# Altium footprint library Trenz.PcbLib: 4 footprints
Each footprint in its own frame and in the unit in brackets; x right, y up, seen from the top. Pads: shape width x height; smd on the part's side, far side on the other; paste and mask are expansions set on the pad; w line width, h text height; cw(c..) or ccw(c..) is an arc to the next point about the centre after c.
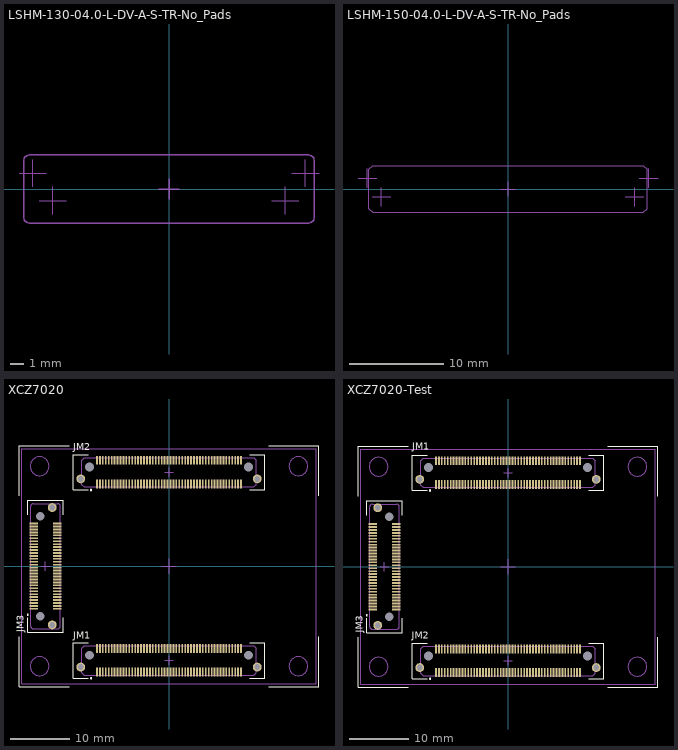
[diagram p0: the footprints below, top view; thin cyan lines are the x and y axes]

## LSHM-130-04.0-L-DV-A-S-TR-No_Pads [mm] "Hermaphroditic Terminal/Socket Strip, 2x30 Positions, Pitch 0.5mm"
Mechanical 13:
  lines w0.1: -10.625,-2.09 ccw(c-10.225,-2.09) -10.225,-2.49 10.225,-2.49 ccw(c10.225,-2.09) 10.625,-2.09 10.625,2.09 ccw(c10.225,2.09) 10.225,2.49 -10.225,2.49 ccw(c-10.225,2.09) -10.625,2.09 -10.625,-2.09
Mechanical 15:
  lines w0.05: -10.975,1.15 -8.975,1.15 ; -9.975,0.15 -9.975,2.15 ; -9.5,-0.85 -7.5,-0.85 ; -8.5,-1.85 -8.5,0.15 ; 7.5,-0.85 9.5,-0.85 ; 8.5,-1.85 8.5,0.15 ; 8.975,1.15 10.975,1.15 ; 9.975,0.15 9.975,2.15
  lines w0.1: -0.75,0 0.75,0 ; 0,-0.75 0,0.75
3D body "LSHM-130-04.0-L-DV-A-S-TR.stp": height 5.45, standoff -1.65, extent -10.399,-2.49 10.4,2.49

## LSHM-150-04.0-L-DV-A-S-TR-No_Pads [mm] "Hermaphroditic Terminal/Socket Strip, 2x50 Positions, Pitch 0.5mm"
Mechanical 13:
  lines w0.1: -14.85,-2.09 -14.45,-2.49 14.45,-2.49 14.85,-2.09 14.85,2.09 14.45,2.49 -14.45,2.49 -14.85,2.09 -14.85,-2.09
Mechanical 15:
  lines w0.05: -16,1.15 -14,1.15 ; -15,0.15 -15,2.15 ; -14.5,-0.85 -12.5,-0.85 ; -13.5,-1.85 -13.5,0.15 ; 12.5,-0.85 14.5,-0.85 ; 13.5,-1.85 13.5,0.15 ; 14,1.15 16,1.15 ; 15,0.15 15,2.15
  lines w0.1: -0.75,0 0.75,0 ; 0,-0.75 0,0.75
3D body "LSHM-150-04.0-L-DV-A-S-TR.stp": height 5.45, standoff -1.65, extent -15.399,-2.49 15.399,2.49

## XCZ7020 [mm] "SoC w/ Xilinx Zynq Module, 40x50mm"
pads (272):
  round 1.5 hole 1 mask+0.075: G1(-19.85,-9.975) G1(-15,-17.15) G1(-15,14.85) G2(-19.85,9.975) G2(15,-17.15) G2(15,14.85)
  rect 0.3x1.5 smd mask+0.05: JM1_01(-12.25,-14) JM1_02(-12.25,-18) JM1_03(-11.75,-14) JM1_04(-11.75,-18) JM1_05(-11.25,-14) JM1_06(-11.25,-18) JM1_07(-10.75,-14) JM1_08(-10.75,-18) JM1_09(-10.25,-14) JM1_10(-10.25,-18) JM1_11(-9.75,-14) JM1_12(-9.75,-18) JM1_13(-9.25,-14) JM1_14(-9.25,-18) JM1_15(-8.75,-14) JM1_16(-8.75,-18) JM1_17(-8.25,-14) JM1_18(-8.25,-18) JM1_19(-7.75,-14) JM1_20(-7.75,-18) JM1_21(-7.25,-14) JM1_22(-7.25,-18) JM1_23(-6.75,-14) JM1_24(-6.75,-18) JM1_25(-6.25,-14) JM1_26(-6.25,-18) JM1_27(-5.75,-14) JM1_28(-5.75,-18) JM1_29(-5.25,-14) JM1_30(-5.25,-18) JM1_31(-4.75,-14) JM1_32(-4.75,-18) JM1_33(-4.25,-14) JM1_34(-4.25,-18) JM1_35(-3.75,-14) JM1_36(-3.75,-18) JM1_37(-3.25,-14) JM1_38(-3.25,-18) JM1_39(-2.75,-14) JM1_40(-2.75,-18) JM1_41(-2.25,-14) JM1_42(-2.25,-18) JM1_43(-1.75,-14) JM1_44(-1.75,-18) JM1_45(-1.25,-14) JM1_46(-1.25,-18) JM1_47(-0.75,-14) JM1_48(-0.75,-18) JM1_49(-0.25,-14) JM1_50(-0.25,-18) JM1_51(0.25,-14) JM1_52(0.25,-18) JM1_53(0.75,-14) JM1_54(0.75,-18) JM1_55(1.25,-14) JM1_56(1.25,-18) JM1_57(1.75,-14) JM1_58(1.75,-18) JM1_59(2.25,-14) JM1_60(2.25,-18) JM1_61(2.75,-14) JM1_62(2.75,-18) JM1_63(3.25,-14) JM1_64(3.25,-18) JM1_65(3.75,-14) JM1_66(3.75,-18) JM1_67(4.25,-14) JM1_68(4.25,-18) JM1_69(4.75,-14) JM1_70(4.75,-18) JM1_71(5.25,-14) JM1_72(5.25,-18) JM1_73(5.75,-14) JM1_74(5.75,-18) JM1_75(6.25,-14) JM1_76(6.25,-18) JM1_77(6.75,-14) JM1_78(6.75,-18) JM1_79(7.25,-14) JM1_80(7.25,-18) JM1_81(7.75,-14) JM1_82(7.75,-18) JM1_83(8.25,-14) JM1_84(8.25,-18) JM1_85(8.75,-14) JM1_86(8.75,-18) JM1_87(9.25,-14) JM1_88(9.25,-18) JM1_89(9.75,-14) JM1_90(9.75,-18) JM1_91(10.25,-14) JM1_92(10.25,-18) JM1_93(10.75,-14) JM1_94(10.75,-18) JM1_95(11.25,-14) JM1_96(11.25,-18) JM1_97(11.75,-14) JM1_98(11.75,-18) JM1_99(12.25,-14) JM1_100(12.25,-18) JM2_01(-12.25,18) JM2_02(-12.25,14) JM2_03(-11.75,18) JM2_04(-11.75,14) JM2_05(-11.25,18) JM2_06(-11.25,14) JM2_07(-10.75,18) JM2_08(-10.75,14) JM2_09(-10.25,18) JM2_10(-10.25,14) JM2_11(-9.75,18) JM2_12(-9.75,14) JM2_13(-9.25,18) JM2_14(-9.25,14) JM2_15(-8.75,18) JM2_16(-8.75,14) JM2_17(-8.25,18) JM2_18(-8.25,14) JM2_19(-7.75,18) JM2_20(-7.75,14) JM2_21(-7.25,18) JM2_22(-7.25,14) JM2_23(-6.75,18) JM2_24(-6.75,14) JM2_25(-6.25,18) JM2_26(-6.25,14) JM2_27(-5.75,18) JM2_28(-5.75,14) JM2_29(-5.25,18) JM2_30(-5.25,14) JM2_31(-4.75,18) JM2_32(-4.75,14) JM2_33(-4.25,18) JM2_34(-4.25,14) JM2_35(-3.75,18) JM2_36(-3.75,14) JM2_37(-3.25,18) JM2_38(-3.25,14) JM2_39(-2.75,18) JM2_40(-2.75,14) JM2_41(-2.25,18) JM2_42(-2.25,14) JM2_43(-1.75,18) JM2_44(-1.75,14) JM2_45(-1.25,18) JM2_46(-1.25,14) JM2_47(-0.75,18) JM2_48(-0.75,14) JM2_49(-0.25,18) JM2_50(-0.25,14) JM2_51(0.25,18) JM2_52(0.25,14) JM2_53(0.75,18) JM2_54(0.75,14) JM2_55(1.25,18) JM2_56(1.25,14) JM2_57(1.75,18) JM2_58(1.75,14) JM2_59(2.25,18) JM2_60(2.25,14) JM2_61(2.75,18) JM2_62(2.75,14) JM2_63(3.25,18) JM2_64(3.25,14) JM2_65(3.75,18) JM2_66(3.75,14) JM2_67(4.25,18) JM2_68(4.25,14) JM2_69(4.75,18) JM2_70(4.75,14) JM2_71(5.25,18) JM2_72(5.25,14) JM2_73(5.75,18) JM2_74(5.75,14) JM2_75(6.25,18) JM2_76(6.25,14) JM2_77(6.75,18) JM2_78(6.75,14) JM2_79(7.25,18) JM2_80(7.25,14) JM2_81(7.75,18) JM2_82(7.75,14) JM2_83(8.25,18) JM2_84(8.25,14) JM2_85(8.75,18) JM2_86(8.75,14) JM2_87(9.25,18) JM2_88(9.25,14) JM2_89(9.75,18) JM2_90(9.75,14) JM2_91(10.25,18) JM2_92(10.25,14) JM2_93(10.75,18) JM2_94(10.75,14) JM2_95(11.25,18) JM2_96(11.25,14) JM2_97(11.75,18) JM2_98(11.75,14) JM2_99(12.25,18) JM2_100(12.25,14)
  rect 1.5x0.3 smd mask+0.05: JM3_01(-23,-7.25) JM3_02(-19,-7.25) JM3_03(-23,-6.75) JM3_04(-19,-6.75) JM3_05(-23,-6.25) JM3_06(-19,-6.25) JM3_07(-23,-5.75) JM3_08(-19,-5.75) JM3_09(-23,-5.25) JM3_10(-19,-5.25) JM3_11(-23,-4.75) JM3_12(-19,-4.75) JM3_13(-23,-4.25) JM3_14(-19,-4.25) JM3_15(-23,-3.75) JM3_16(-19,-3.75) JM3_17(-23,-3.25) JM3_18(-19,-3.25) JM3_19(-23,-2.75) JM3_20(-19,-2.75) JM3_21(-23,-2.25) JM3_22(-19,-2.25) JM3_23(-23,-1.75) JM3_24(-19,-1.75) JM3_25(-23,-1.25) JM3_26(-19,-1.25) JM3_27(-23,-0.75) JM3_28(-19,-0.75) JM3_29(-23,-0.25) JM3_30(-19,-0.25) JM3_31(-23,0.25) JM3_32(-19,0.25) JM3_33(-23,0.75) JM3_34(-19,0.75) JM3_35(-23,1.25) JM3_36(-19,1.25) JM3_37(-23,1.75) JM3_38(-19,1.75) JM3_39(-23,2.25) JM3_40(-19,2.25) JM3_41(-23,2.75) JM3_42(-19,2.75) JM3_43(-23,3.25) JM3_44(-19,3.25) JM3_45(-23,3.75) JM3_46(-19,3.75) JM3_47(-23,4.25) JM3_48(-19,4.25) JM3_49(-23,4.75) JM3_50(-19,4.75) JM3_51(-23,5.25) JM3_52(-19,5.25) JM3_53(-23,5.75) JM3_54(-19,5.75) JM3_55(-23,6.25) JM3_56(-19,6.25) JM3_57(-23,6.75) JM3_58(-19,6.75) JM3_59(-23,7.25) JM3_60(-19,7.25)
  round 0 hole 1.45 unplated: MH(-21.85,-8.5) MH(-21.85,8.5)
  round 0 hole 1.5 unplated: MH(-13.5,-15.15) MH(-13.5,16.85) MH(13.5,-15.15) MH(13.5,16.85)
Top Overlay:
  circle w0.2: c-24,-8.25 r0.1
  circle w0.2: c-13.25,-19.035 r0.1
  circle w0.2: c-13.25,12.965 r0.1
  lines w0.2: -25.5,-12 -25.5,-20.5 -17,-20.5 ; -25.5,12 -25.5,20.5 -17,20.5 ; -24,-8.75 -24,-11.25 -18,-11.25 -18,-8.75 ; -24,8.75 -24,11.25 -18,11.25 -18,8.75 ; -13.75,-19.035 -16.25,-19.035 -16.25,-13.035 -13.75,-13.035 ; -13.75,12.965 -16.25,12.965 -16.25,18.965 -13.75,18.965 ; 13.75,-19.035 16.25,-19.035 16.25,-13.035 13.75,-13.035 ; 13.75,12.965 16.25,12.965 16.25,18.965 13.75,18.965 ; 17,-20.5 25.5,-20.5 25.5,-12 ; 17,20.5 25.5,20.5 25.5,12
  text "JM3" at -24.25,-11.25 h2
  text "JM2" at -16.25,19.25 h2
  text "JM1" at -16.25,-12.75 h2
Top Paste:
  region: -19.85,-10.983 -19.589,-10.949 -19.346,-10.848 -19.137,-10.688 -18.977,-10.479 -18.876,-10.236 -18.841,-9.975 -18.876,-9.714 -18.977,-9.47 -19.137,-9.262 -19.346,-9.101 -19.589,-9.001 -19.85,-8.966 -20.111,-9.001 -20.354,-9.101 -20.563,-9.262 -20.724,-9.47 -20.824,-9.714 -20.859,-9.975 -20.824,-10.236 -20.724,-10.479 -20.563,-10.688 -20.354,-10.848 -20.111,-10.949
  region: -19.85,8.967 -19.589,9.001 -19.346,9.102 -19.137,9.262 -18.977,9.471 -18.876,9.714 -18.841,9.975 -18.876,10.236 -18.977,10.48 -19.137,10.688 -19.346,10.849 -19.589,10.949 -19.85,10.984 -20.111,10.949 -20.354,10.849 -20.563,10.688 -20.724,10.48 -20.824,10.236 -20.859,9.975 -20.824,9.714 -20.724,9.471 -20.563,9.262 -20.354,9.102 -20.111,9.001
Mechanical 13:
  circle w0.1: c-22,17 r1.6
  circle w0.1: c-22,-17 r1.6
  circle w0.1: c22,-17 r1.6
  circle w0.1: c22,17 r1.6
  lines w0.1: -25,-20 25,-20 25,20 -25,20 -25,-20 ; -23.49,-10.225 ccw(c-23.09,-10.225) -23.09,-10.625 -18.91,-10.625 ccw(c-18.91,-10.225) -18.51,-10.225 -18.51,10.225 ccw(c-18.91,10.225) -18.91,10.625 -23.09,10.625 ccw(c-23.09,10.225) -23.49,10.225 -23.49,-10.225 ; -14.85,-18.125 -14.85,-13.945 -14.45,-13.545 14.45,-13.545 14.85,-13.945 14.85,-18.125 14.45,-18.525 -14.45,-18.525 -14.85,-18.125 ; -14.85,13.875 -14.45,13.475 14.45,13.475 14.85,13.875 14.85,18.055 14.45,18.455 -14.45,18.455 -14.85,18.055 -14.85,13.875
Mechanical 15:
  lines w0.1: -21.75,0 -20.25,0 ; -21,-0.75 -21,0.75 ; -1.25,0 1.25,0 ; -0.75,-16 0.75,-16 ; -0.75,16 0.75,16 ; 0,-16.75 0,-15.25 ; 0,-1.25 0,1.25 ; 0,15.215 0,16.715
3D body "TE0720-03.step": height 11.15, standoff 2.31, extent -25,-20 25,20

## XCZ7020-Test [mm] "SoC w/ Xilinx Zynq Module, 40x50mm"
pads (272):
  round 1.5 hole 1 mask+0.075: G1(-22.15,-9.975) G1(-15,-17.15) G1(-15,14.85) G2(-22.15,10.025) G2(15,-17.15) G2(15,14.85)
  rect 0.3x1.5 smd mask+0.05: JM1_01(-12.25,14) JM1_02(-12.25,18) JM1_03(-11.75,14) JM1_04(-11.75,18) JM1_05(-11.25,14) JM1_06(-11.25,18) JM1_07(-10.75,14) JM1_08(-10.75,18) JM1_09(-10.25,14) JM1_10(-10.25,18) JM1_11(-9.75,14) JM1_12(-9.75,18) JM1_13(-9.25,14) JM1_14(-9.25,18) JM1_15(-8.75,14) JM1_16(-8.75,18) JM1_17(-8.25,14) JM1_18(-8.25,18) JM1_19(-7.75,14) JM1_20(-7.75,18) JM1_21(-7.25,14) JM1_22(-7.25,18) JM1_23(-6.75,14) JM1_24(-6.75,18) JM1_25(-6.25,14) JM1_26(-6.25,18) JM1_27(-5.75,14) JM1_28(-5.75,18) JM1_29(-5.25,14) JM1_30(-5.25,18) JM1_31(-4.75,14) JM1_32(-4.75,18) JM1_33(-4.25,14) JM1_34(-4.25,18) JM1_35(-3.75,14) JM1_36(-3.75,18) JM1_37(-3.25,14) JM1_38(-3.25,18) JM1_39(-2.75,14) JM1_40(-2.75,18) JM1_41(-2.25,14) JM1_42(-2.25,18) JM1_43(-1.75,14) JM1_44(-1.75,18) JM1_45(-1.25,14) JM1_46(-1.25,18) JM1_47(-0.75,14) JM1_48(-0.75,18) JM1_49(-0.25,14) JM1_50(-0.25,18) JM1_51(0.25,14) JM1_52(0.25,18) JM1_53(0.75,14) JM1_54(0.75,18) JM1_55(1.25,14) JM1_56(1.25,18) JM1_57(1.75,14) JM1_58(1.75,18) JM1_59(2.25,14) JM1_60(2.25,18) JM1_61(2.75,14) JM1_62(2.75,18) JM1_63(3.25,14) JM1_64(3.25,18) JM1_65(3.75,14) JM1_66(3.75,18) JM1_67(4.25,14) JM1_68(4.25,18) JM1_69(4.75,14) JM1_70(4.75,18) JM1_71(5.25,14) JM1_72(5.25,18) JM1_73(5.75,14) JM1_74(5.75,18) JM1_75(6.25,14) JM1_76(6.25,18) JM1_77(6.75,14) JM1_78(6.75,18) JM1_79(7.25,14) JM1_80(7.25,18) JM1_81(7.75,14) JM1_82(7.75,18) JM1_83(8.25,14) JM1_84(8.25,18) JM1_85(8.75,14) JM1_86(8.75,18) JM1_87(9.25,14) JM1_88(9.25,18) JM1_89(9.75,14) JM1_90(9.75,18) JM1_91(10.25,14) JM1_92(10.25,18) JM1_93(10.75,14) JM1_94(10.75,18) JM1_95(11.25,14) JM1_96(11.25,18) JM1_97(11.75,14) JM1_98(11.75,18) JM1_99(12.25,14) JM1_100(12.25,18) JM2_01(-12.25,-18) JM2_02(-12.25,-14) JM2_03(-11.75,-18) JM2_04(-11.75,-14) JM2_05(-11.25,-18) JM2_06(-11.25,-14) JM2_07(-10.75,-18) JM2_08(-10.75,-14) JM2_09(-10.25,-18) JM2_10(-10.25,-14) JM2_11(-9.75,-18) JM2_12(-9.75,-14) JM2_13(-9.25,-18) JM2_14(-9.25,-14) JM2_15(-8.75,-18) JM2_16(-8.75,-14) JM2_17(-8.25,-18) JM2_18(-8.25,-14) JM2_19(-7.75,-18) JM2_20(-7.75,-14) JM2_21(-7.25,-18) JM2_22(-7.25,-14) JM2_23(-6.75,-18) JM2_24(-6.75,-14) JM2_25(-6.25,-18) JM2_26(-6.25,-14) JM2_27(-5.75,-18) JM2_28(-5.75,-14) JM2_29(-5.25,-18) JM2_30(-5.25,-14) JM2_31(-4.75,-18) JM2_32(-4.75,-14) JM2_33(-4.25,-18) JM2_34(-4.25,-14) JM2_35(-3.75,-18) JM2_36(-3.75,-14) JM2_37(-3.25,-18) JM2_38(-3.25,-14) JM2_39(-2.75,-18) JM2_40(-2.75,-14) JM2_41(-2.25,-18) JM2_42(-2.25,-14) JM2_43(-1.75,-18) JM2_44(-1.75,-14) JM2_45(-1.25,-18) JM2_46(-1.25,-14) JM2_47(-0.75,-18) JM2_48(-0.75,-14) JM2_49(-0.25,-18) JM2_50(-0.25,-14) JM2_51(0.25,-18) JM2_52(0.25,-14) JM2_53(0.75,-18) JM2_54(0.75,-14) JM2_55(1.25,-18) JM2_56(1.25,-14) JM2_57(1.75,-18) JM2_58(1.75,-14) JM2_59(2.25,-18) JM2_60(2.25,-14) JM2_61(2.75,-18) JM2_62(2.75,-14) JM2_63(3.25,-18) JM2_64(3.25,-14) JM2_65(3.75,-18) JM2_66(3.75,-14) JM2_67(4.25,-18) JM2_68(4.25,-14) JM2_69(4.75,-18) JM2_70(4.75,-14) JM2_71(5.25,-18) JM2_72(5.25,-14) JM2_73(5.75,-18) JM2_74(5.75,-14) JM2_75(6.25,-18) JM2_76(6.25,-14) JM2_77(6.75,-18) JM2_78(6.75,-14) JM2_79(7.25,-18) JM2_80(7.25,-14) JM2_81(7.75,-18) JM2_82(7.75,-14) JM2_83(8.25,-18) JM2_84(8.25,-14) JM2_85(8.75,-18) JM2_86(8.75,-14) JM2_87(9.25,-18) JM2_88(9.25,-14) JM2_89(9.75,-18) JM2_90(9.75,-14) JM2_91(10.25,-18) JM2_92(10.25,-14) JM2_93(10.75,-18) JM2_94(10.75,-14) JM2_95(11.25,-18) JM2_96(11.25,-14) JM2_97(11.75,-18) JM2_98(11.75,-14) JM2_99(12.25,-18) JM2_100(12.25,-14)
  rect 1.5x0.3 smd mask+0.05: JM3_01(-23,7.25) JM3_02(-19,7.25) JM3_03(-23,6.75) JM3_04(-19,6.75) JM3_05(-23,6.25) JM3_06(-19,6.25) JM3_07(-23,5.75) JM3_08(-19,5.75) JM3_09(-23,5.25) JM3_10(-19,5.25) JM3_11(-23,4.75) JM3_12(-19,4.75) JM3_13(-23,4.25) JM3_14(-19,4.25) JM3_15(-23,3.75) JM3_16(-19,3.75) JM3_17(-23,3.25) JM3_18(-19,3.25) JM3_19(-23,2.75) JM3_20(-19,2.75) JM3_21(-23,2.25) JM3_22(-19,2.25) JM3_23(-23,1.75) JM3_24(-19,1.75) JM3_25(-23,1.25) JM3_26(-19,1.25) JM3_27(-23,0.75) JM3_28(-19,0.75) JM3_29(-23,0.25) JM3_30(-19,0.25) JM3_31(-23,-0.25) JM3_32(-19,-0.25) JM3_33(-23,-0.75) JM3_34(-19,-0.75) JM3_35(-23,-1.25) JM3_36(-19,-1.25) JM3_37(-23,-1.75) JM3_38(-19,-1.75) JM3_39(-23,-2.25) JM3_40(-19,-2.25) JM3_41(-23,-2.75) JM3_42(-19,-2.75) JM3_43(-23,-3.25) JM3_44(-19,-3.25) JM3_45(-23,-3.75) JM3_46(-19,-3.75) JM3_47(-23,-4.25) JM3_48(-19,-4.25) JM3_49(-23,-4.75) JM3_50(-19,-4.75) JM3_51(-23,-5.25) JM3_52(-19,-5.25) JM3_53(-23,-5.75) JM3_54(-19,-5.75) JM3_55(-23,-6.25) JM3_56(-19,-6.25) JM3_57(-23,-6.75) JM3_58(-19,-6.75) JM3_59(-23,-7.25) JM3_60(-19,-7.25)
  round 0 hole 1.45 unplated: MH(-20.15,-8.5) MH(-20.15,8.5)
  round 0 hole 1.5 unplated: MH(-13.5,-15.15) MH(-13.5,16.85) MH(13.5,-15.15) MH(13.5,16.85)
Top Overlay:
  circle w0.2: c-24,-8.25 r0.1
  circle w0.2: c-13.25,-19.035 r0.1
  circle w0.2: c-13.25,12.965 r0.1
  lines w0.2: -25.5,-12 -25.5,-20.5 -17,-20.5 ; -25.5,12 -25.5,20.5 -17,20.5 ; -24,-8.75 -24,-11.25 -18,-11.25 -18,-8.75 ; -24,8.75 -24,11.25 -18,11.25 -18,8.75 ; -13.75,-19.035 -16.25,-19.035 -16.25,-13.035 -13.75,-13.035 ; -13.75,12.965 -16.25,12.965 -16.25,18.965 -13.75,18.965 ; 13.75,-19.035 16.25,-19.035 16.25,-13.035 13.75,-13.035 ; 13.75,12.965 16.25,12.965 16.25,18.965 13.75,18.965 ; 17,-20.5 25.5,-20.5 25.5,-12 ; 17,20.5 25.5,20.5 25.5,12
  text "JM3" at -24.25,-11.25 h2
  text "JM2" at -16.325,-12.7 h2
  text "JM1" at -16.275,19.425 h2
Mechanical 13:
  circle w0.1: c-22,17 r1.6
  circle w0.1: c-22,-17 r1.6
  circle w0.1: c22,-17 r1.6
  circle w0.1: c22,17 r1.6
  lines w0.1: -25,-20 25,-20 25,20 -25,20 -25,-20 ; -23.49,-10.225 ccw(c-23.09,-10.225) -23.09,-10.625 -18.91,-10.625 ccw(c-18.91,-10.225) -18.51,-10.225 -18.51,10.225 ccw(c-18.91,10.225) -18.91,10.625 -23.09,10.625 ccw(c-23.09,10.225) -23.49,10.225 -23.49,-10.225 ; -14.85,-18.125 -14.85,-13.945 -14.45,-13.545 14.45,-13.545 14.85,-13.945 14.85,-18.125 14.45,-18.525 -14.45,-18.525 -14.85,-18.125 ; -14.85,13.875 -14.45,13.475 14.45,13.475 14.85,13.875 14.85,18.055 14.45,18.455 -14.45,18.455 -14.85,18.055 -14.85,13.875
Mechanical 15:
  lines w0.1: -21.75,0 -20.25,0 ; -21,-0.75 -21,0.75 ; -1.25,0 1.25,0 ; -0.75,-16 0.75,-16 ; -0.75,16 0.75,16 ; 0,-16.75 0,-15.25 ; 0,-1.25 0,1.25 ; 0,15.215 0,16.715
3D body "LSHM-150-04.0-L-DV-A-S-TR.stp": height 5.45, standoff -1.65, extent -15.399,13.475 15.399,18.455
3D body "LSHM-130-04.0-L-DV-A-S-TR.stp": height 5.45, standoff -1.65, extent -23.49,-10.399 -18.51,10.399
3D body "LSHM-150-04.0-L-DV-A-S-TR.stp": height 5.45, standoff -1.65, extent -15.399,-18.525 15.399,-13.545